# Altium footprint library Item_pcb.PcbLib: 282 footprints (part 1 of 18)
Each footprint in its own frame and in the unit in brackets; x right, y up, seen from the top. Pads: shape width x height; smd on the part's side, far side on the other; paste and mask are expansions set on the pad; w line width, h text height; cw(c..) or ccw(c..) is an arc to the next point about the centre after c.
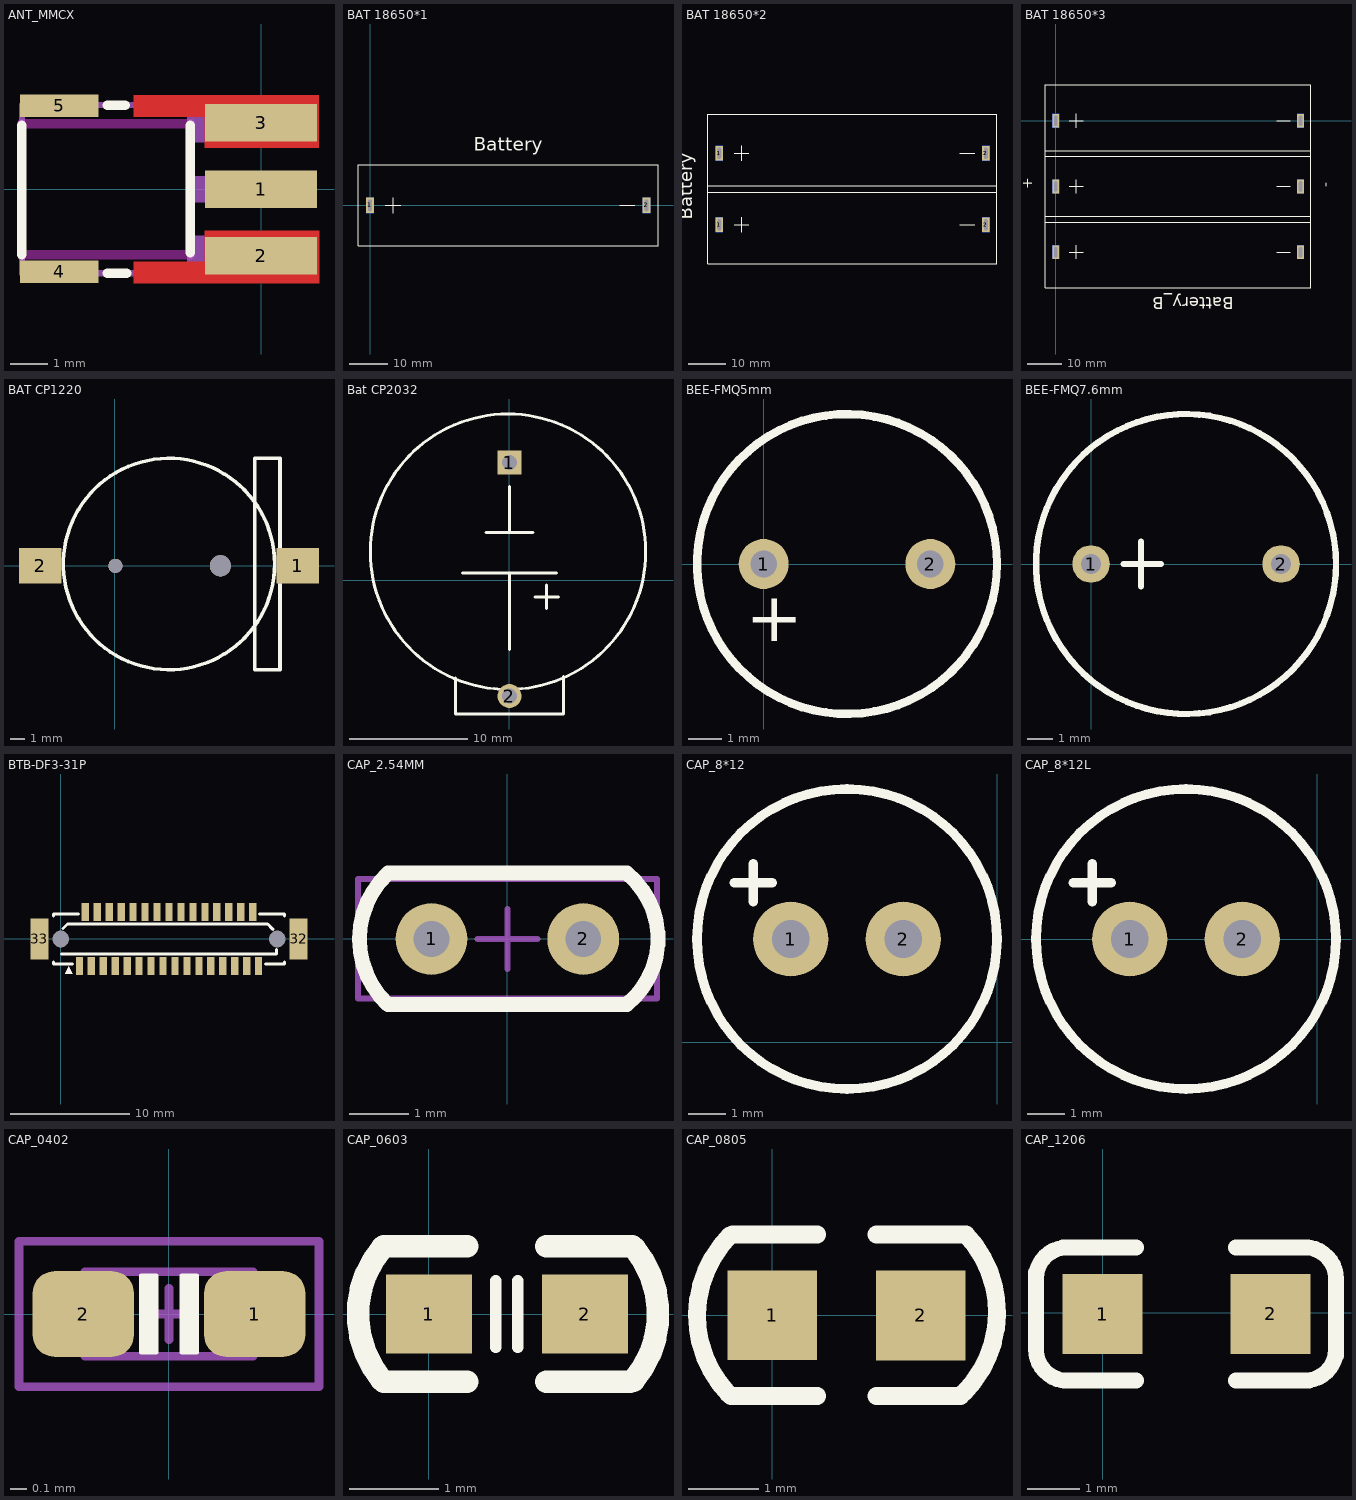
[diagram p0: the footprints below, top view; thin cyan lines are the x and y axes]

## ANT_MMCX [mm] "异型4.5X7.5MM"
pads (5):
  rect 3x1 smd paste+0 mask+0.05: 1(0,0) 2(0,-1.778) 3(0,1.778)
  rect 2.1x0.6 smd paste+0 mask+0.05: 4(-5.4,-2.212) 5(-5.4,2.237)
Top Layer:
  region: 1.55,-2.512 -1.5,-2.512 -3.4,-2.512 -3.4,-1.937 -1.5,-1.937 -1.5,-1.112 1.55,-1.112
  region: 1.55,2.512 -1.5,2.512 -3.4,2.512 -3.4,1.937 -1.5,1.937 -1.5,1.113 1.55,1.113
Top Overlay:
  lines w0.254: -6.4,-1.75 -6.4,1.706 ; -4.119,-2.25 -3.6,-2.25 ; -4.118,2.25 -3.631,2.25 ; -1.9,-1.706 -1.9,1.706
Keep-Out Layer:
  lines w0.254: -1.9,-1.75 -1.9,1.75 ; -1.9,-1.75 -6.4,-1.75 -1.9,-1.75 ; -1.9,-1.75 -1.9,1.75 ; -1.9,1.75 -6.4,1.75 -1.9,1.75
Mechanical 6:
  region: -6.324,2.25 -6.324,-2.174 -1.9,-2.174 -1.869,-2.174 -1.824,-2.219 -1.824,-2.281 -1.869,-2.326 -1.9,-2.326 -6.4,-2.326 -6.415,-2.326 -6.443,-2.314 -6.464,-2.293 -6.476,-2.265 -6.476,-2.25 -6.476,2.25 -6.476,2.281 -6.431,2.326 -6.369,2.326 -6.324,2.281
  region: -6.4,2.326 -1.9,2.326 -1.885,2.326 -1.857,2.314 -1.836,2.293 -1.824,2.265 -1.824,2.25 -1.824,-2.25 -1.824,-2.281 -1.869,-2.326 -1.931,-2.326 -1.976,-2.281 -1.976,-2.25 -1.976,2.174 -6.4,2.174 -6.431,2.174 -6.476,2.219 -6.476,2.281 -6.431,2.326
Mechanical 15:
  region: 1.16,-2.262 1.159,-2.238 1.124,-2.204 1.076,-2.204 1.041,-2.238 1.04,-2.262 1.041,-2.287 1.076,-2.32 1.124,-2.32 1.159,-2.287
  region: -6.25,-1.95 -4.55,-1.95 -4.55,-2.262 -6.25,-2.262
  region: 1.1,-1.25 -1.95,-1.25 -1.95,-1.95 -3.35,-1.95 -3.35,-2.25 1.1,-2.25
  region: -1.95,0.35 1.1,0.35 1.1,-0.35 -1.95,-0.35
  region: 1.1,1.25 -1.95,1.25 -1.95,1.95 -3.35,1.95 -3.35,2.25 1.1,2.25
  region: -4.55,1.975 -6.25,1.975 -6.25,2.288 -4.55,2.288
  lines w0.051: -6.4,-2.25 -6.4,2.25 -1.9,2.25 -1.9,-2.25 -6.4,-2.25

## BAT 18650*1 [mm]
pads (4):
  rect 2x4 hole 1 slot 3 at 90 deg: 1(-0.009,0) 2(71.873,0)
  rect 2x4 smd far side: 1(-0.009,0) 2(71.873,0)
Top Overlay:
  lines w0.254: 3.991,0 7.991,0 ; 5.991,-2 5.991,2 ; 64.873,0 68.873,0 ; -3.127,-10.5 74.873,-10.5 74.873,10.5 -3.127,10.5 -3.127,-10.5
  text "Battery" at 27,13 h6
3D body "User Library-18650 Full.STEP": height 23.65, standoff -1.83, extent -2.93,-10.298 74.72,10.502

## BAT 18650*2 [mm]
pads (8):
  rect 2x4 hole 1 slot 3 at 90 deg: 1(-184,198.7) 1(-184,218) 2(-112.118,198.7) 2(-112.118,218)
  rect 2x4 smd far side: 1(-184,198.7) 1(-184,218) 2(-112.118,198.7) 2(-112.118,218)
Top Overlay:
  lines w0.254: -180,198.7 -176,198.7 ; -180,218 -176,218 ; -178,196.7 -178,200.7 ; -178,216 -178,220 ; -119.118,198.7 -115.118,198.7 ; -119.118,218 -115.118,218 ; -187.118,188.2 -187.118,209.2 -109.118,209.2 -109.118,188.2 -187.118,188.2 ; -187.118,207.5 -187.118,228.5 -109.118,228.5 -109.118,207.5 -187.118,207.5
  text "Battery" at -190,200 h6
3D body "User Library-18650 Full.STEP": height 25.65, standoff 0.17, extent -186.921,188.402 -109.271,209.202
3D body "User Library-18650 Full.STEP": height 25.65, standoff 0.17, extent -186.921,207.702 -109.271,228.502

## BAT 18650*3 [mm]
pads (12):
  rect 2x4 smd far side: 1(-0.025,-38.625) 1(-0.025,-19.325) 1(-0.025,-0.025) 2(71.857,-38.625) 2(71.857,-19.325) 2(71.857,-0.025)
  rect 2x4 hole 1 slot 3 at 90 deg: 1(-0.025,-38.625) 1(-0.025,-19.325) 1(-0.025,-0.025) 2(71.857,-38.625) 2(71.857,-19.325) 2(71.857,-0.025)
Top Overlay:
  lines w0.254: 3.975,-38.625 7.975,-38.625 ; 3.975,-19.325 7.975,-19.325 ; 3.975,-0.025 7.975,-0.025 ; 5.975,-40.625 5.975,-36.625 ; 5.975,-21.325 5.975,-17.325 ; 5.975,-2.025 5.975,1.975 ; 64.857,-38.625 68.857,-38.625 ; 64.857,-19.325 68.857,-19.325 ; 64.857,-0.025 68.857,-0.025 ; -3.143,-49.125 74.857,-49.125 74.857,-28.125 -3.143,-28.125 -3.143,-49.125 ; -3.143,-29.825 74.857,-29.825 74.857,-8.825 -3.143,-8.825 -3.143,-29.825 ; -3.143,-10.525 74.857,-10.525 74.857,10.475 -3.143,10.475 -3.143,-10.525
  text "-" at 77.175,-18.125 h5.08
  text "+" at -5.825,-20.125 h5.08
  text "Battery_B" at 52.175,-50.625 h6
3D body "User Library-18650 Full.STEP": height 23.65, standoff -1.83, extent -2.946,-10.324 74.704,10.476
3D body "User Library-18650 Full.STEP": height 23.65, standoff -1.83, extent -2.946,-29.624 74.704,-8.824
3D body "User Library-18650 Full.STEP": height 23.65, standoff -1.83, extent -2.946,-48.924 74.704,-28.124

## BAT CP1220 [mm]
pads (4):
  rect 3x2.5 smd: 1(12.988,0) 2(-5.3,0)
  round 1 hole 1: ""(0.038,0)
  round 1.5 hole 1.5: ""(7.488,0)
Top Overlay:
  circle w0.254: c3.844,0.128 r7.5
  lines w0.254: 9.94,-7.366 9.94,7.62 11.718,7.62 11.718,-7.366 9.94,-7.366
3D body "cr1220smd.STEP": height 4.94, standoff 0, extent -5.096,-7.519 13.404,7.477

## Bat CP2032 [mil] "20MM"
pads (2):
  rect 80x80 hole 50: 1(0,393.7)
  round 80 hole 50: 2(0,-386.3)
Top Overlay:
  circle w10: c-5,95.7 r460
  lines w10: -180,-326.3 -180,-446.3 180,-446.3 180,-320.3 ; -157,24.7 157,24.7 ; -78,160.62 78,160.62 ; 0,-231.3 0,24.7 ; 0,162.01 0,313.7 ; 85.22,-55.06 164.22,-55.06 ; 124.22,-94.06 124.22,-15.06
3D body "bat_n.stp": height 301.57, standoff -181.11, extent -435.9,-432.27 435.48,519.22

## BEE-FMQ5mm [mm]
pads (2):
  round 1.5 hole 0.8: 1(0,0) 2(5,0)
Top Overlay:
  circle w0.254: c2.5,0 r4.5
  text "+" at -0.533,-2.311 h1.5
3D body "cst-951ap.stp": height 4.5, standoff -4.5, extent -2,-4.5 7,4.5

## BEE-FMQ7.6mm [mm]
pads (2):
  round 1.5 hole 0.8: 1(0,0) 2(7.6,0)
Top Overlay:
  circle w0.254: c3.799,0 r6.001
  lines w0.254: 1.3,0 2.8,0 ; 2,-0.9 2,0.9
3D body "User Library-WST-1203UX.STEP": height 9.65, standoff -4.5, extent -5.727,-6 9.727,6

## BTB-DF3-31P [mm] "1MM"
pads (35):
  rect 0.6x1.5 smd: 1(1.55,-2.25) 2(2.05,2.25) 3(2.55,-2.25) 4(3.05,2.25) 5(3.55,-2.25) 6(4.05,2.25) 7(4.55,-2.25) 8(5.05,2.25) 9(5.55,-2.25) 10(6.05,2.25) 11(6.55,-2.25) 12(7.05,2.25) 13(7.55,-2.25) 14(8.05,2.25) 15(8.55,-2.25) 16(9.05,2.25) 17(9.55,-2.25) 18(10.05,2.25) 19(10.55,-2.25) 20(11.05,2.25) 21(11.55,-2.25) 22(12.05,2.25) 23(12.55,-2.25) 24(13.05,2.25) 25(13.55,-2.25) 26(14.05,2.25) 27(14.55,-2.25) 28(15.05,2.25) 29(15.55,-2.25) 30(16.05,2.25) 31(16.55,-2.25)
  rect 1.5x3.4 smd: 32(19.9,0) 33(-1.8,0)
  round 1.219 hole 1.4 unplated: ""(0,0) ""(18.1,0)
Top Overlay:
  region: 0.35,-2.9 0.95,-2.9 0.65,-2.3
  lines w0.254: -0.6,-1.926 -0.6,-2.1 0.969,-2.1 ; -0.6,1.926 -0.6,2.1 1.469,2.1 ; 0.05,-1.25 18.05,-1.25 18.05,-0.892 ; 0.175,0.875 0.55,1.25 17.3,1.25 17.735,0.815 ; 16.631,2.1 18.7,2.1 18.7,1.926 ; 17.131,-2.1 18.7,-2.1 18.7,-1.926
Mechanical 15:
  region: 0.35,-2.9 0.95,-2.9 0.65,-2.3
3D body "3D_PCB2_2022-03-05.step": height 3.35, standoff 0.05, extent -1.524,-2.8 19.576,2.8

## CAP_2.54MM [mm]
pads (2):
  round 1.2 hole 0.6: 1(-1.27,0) 2(1.27,0)
Top Overlay:
  lines w0.25: -2,1.097 ccw(c-0.972,-0.002) -2,-1.1 2,-1.1 ; -2,1.1 2,1.1 ; 1.999,-1.099 ccw(c1.1,0) 1.999,1.099
Mechanical 15:
  lines w0.1: -0.5,0 0.5,0 ; 0,-0.5 0,0.5 ; -2.5,-1 2.5,-1 2.5,1 -2.5,1 -2.5,-1
3D body "CAP TR2.54.STEP": height 5.92, standoff -2, extent -2.919,-0.836 2.919,0.86

## CAP_8*12 [mm]
pads (2):
  round 2 hole 1: 1(-5.5,2.75) 2(-2.5,2.75)
Top Overlay:
  circle w0.254: c-4,2.75 r4
  lines w0.254: -7,4.25 -6,4.25 ; -6.5,3.75 -6.5,4.75
3D body: height 12, standoff 0, extent -8,-1.247 0,6.747

## CAP_8*12L [mm]
pads (2):
  round 2 hole 1: 1(-5,0) 2(-2,0)
Top Overlay:
  circle w0.254: c-3.5,0 r4
  lines w0.254: -6.5,1.5 -5.5,1.5 ; -6,1 -6,2
3D body: height 8, standoff 0, extent -7.5,0 0.5,12
3D body: height 4, standoff 0, extent -5.496,-0.499 -4.5,0.499
3D body: height 4, standoff 0, extent -2.496,-0.499 -1.5,0.499

## CAP_0402 [mm]
pads (2):
  rrect50% 0.6x0.508 smd: 1(0.508,0) 2(-0.508,0)
Top Overlay:
  region: 0.165,-0.229 0.076,-0.229 0.076,0.229 0.165,0.229
  region: -0.165,0.229 -0.076,0.229 -0.076,-0.229 -0.165,-0.229
  lines w0.025: -0.165,-0.229 -0.165,0.229 -0.076,0.229 -0.076,-0.229 -0.165,-0.229 ; 0.076,-0.229 0.165,-0.229 0.165,0.229 0.076,0.229 0.076,-0.229
Mechanical 13:
  lines w0.051: -0.152,0 0.152,0 ; 0,-0.152 0,0.152 ; -0.5,-0.25 -0.5,0.25 0.5,0.25 0.5,-0.25 -0.5,-0.25
Mechanical 14:
  lines w0.051: -0.889,-0.432 0.889,-0.432 0.889,0.432 -0.889,0.432 -0.889,-0.432
3D body "CAPC1005X05L.step": height 0.5, standoff 0, extent -0.5,-0.25 0.5,0.25

## CAP_0603 [mil]
pads (2):
  rect 38x35 smd: 1(0,0) 2(69,0)
Top Overlay:
  lines w5: 29.53,-14.83 29.53,14.7 ; 39.37,-14.83 39.37,14.7
  lines w10: -21,-29 cw(c14.45,-0.04) -20.48,29.56 ; -20,-30 17,-30 ; -20,30 17,30 ; 52,-30 89,-30 ; 52,30 90,30 ; 90.48,-29.56 ccw(c55.55,0.04) 91,29
3D body "User Library-0603 SMD Capacitor.STEP": height 11.89, standoff 0, extent 3.8,-15.8 66.8,15.7

## CAP_0805 [mm]
pads (2):
  rect 1.27x1.27 smd: 1(0,0) 2(2.101,-0.003)
Top Overlay:
  lines w0.254: -0.626,-1.109 cw(c0.539,-0.002) -0.602,1.13 ; -0.589,-1.143 0.635,-1.143 ; -0.566,1.143 0.635,1.143 ; 1.473,-1.143 2.667,-1.143 ; 1.473,1.143 2.72,1.143 ; 2.716,-1.093 ccw(c1.574,0.039) 2.743,1.143
3D body "User Library-0805 SMD Capacitor.STEP": height 0.77, standoff -0.01, extent 0.049,-0.622 2.049,0.628

## CAP_1206 [mil]
pads (2):
  rect 60x60 smd: 1(0,-1) 2(126,-1)
Top Overlay:
  lines w11.81: -50,-27 ccw(c-26.5,-27.5) -27,-51 ; -50,26 cw(c-26.5,25.5) -26,49 ; 151,-51 ccw(c151.5,-27.5) 175,-28 ; 152,49 cw(c151.5,25.5) 175,25
  lines w12: -50,-28 -50,30 ; -29,-51 25,-51 ; -28,49 25,49 ; 100,-51 153,-51 ; 100,49 154,49 ; 175,-32 175,26
3D body "Capacitor 1206 SMD1.step": height 39.45, standoff 0, extent 0.01,-32.49 126,30.5